# Altium footprint library En.PcbLib: 157 footprints (part 7 of 10)
Each footprint in its own frame and in the unit in brackets; x right, y up, seen from the top. Pads: shape width x height; smd on the part's side, far side on the other; paste and mask are expansions set on the pad; w line width, h text height; cw(c..) or ccw(c..) is an arc to the next point about the centre after c.
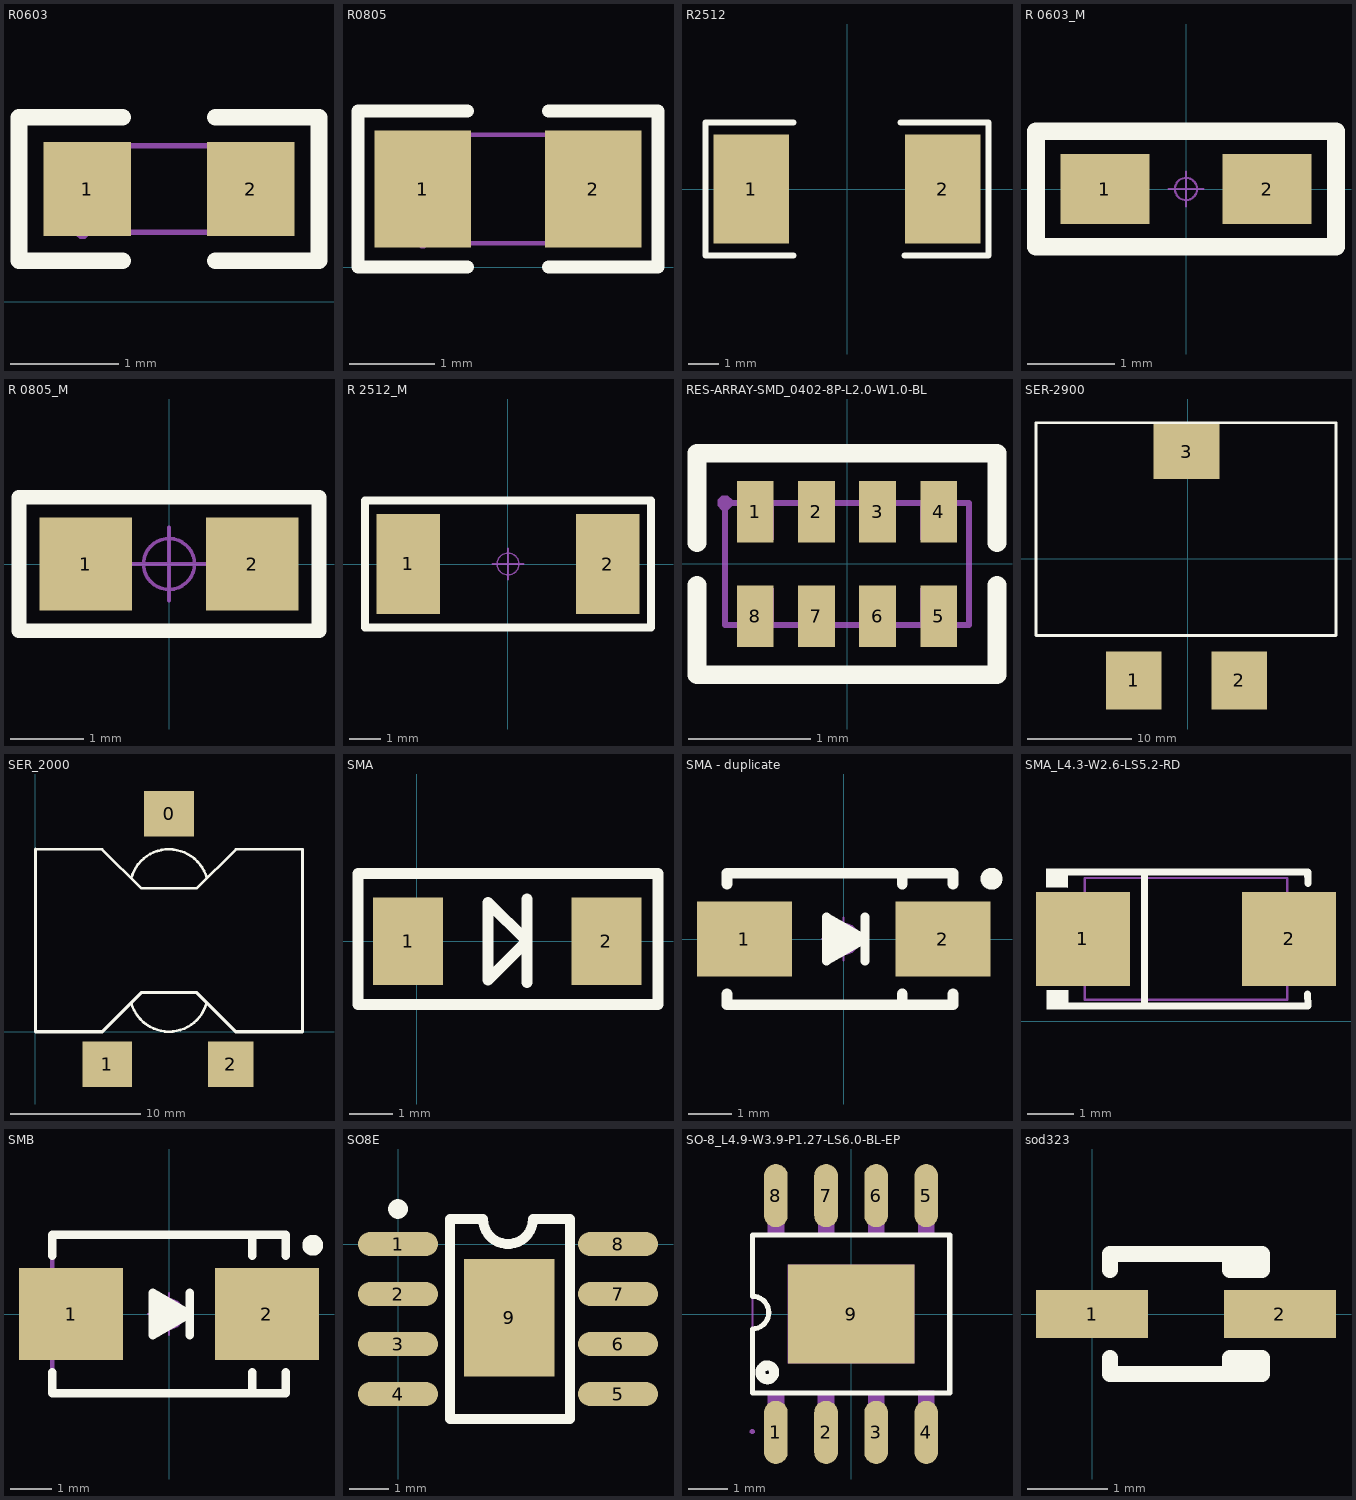
[diagram p6: the footprints below, top view; thin cyan lines are the x and y axes]

## R0603 [mm]
pads (2):
  rect 0.806x0.864 smd paste-100 mask+0.051: 1(33.906,1.042) 2(35.412,1.042)
Top Overlay:
  lines w0.152: 34.233,0.381 33.274,0.381 33.274,1.702 34.233,1.702 ; 35.085,0.381 36.044,0.381 36.044,1.702 35.085,1.702
Top Paste:
  region: 34.304,1.442 34.304,1.214 33.924,1.214 33.924,0.884 34.304,0.884 34.304,0.642 34.254,0.592 33.464,0.592 33.414,0.642 33.414,1.442 33.464,1.492 34.254,1.492
  region: 35.854,1.492 35.054,1.492 35.004,1.442 35.004,1.214 35.374,1.214 35.374,0.884 35.004,0.884 35.004,0.642 35.054,0.592 35.854,0.592 35.904,0.642 35.904,1.442
Mechanical 15:
  region: 33.919,0.642 33.919,0.666 33.884,0.702 33.834,0.702 33.799,0.666 33.799,0.642 33.799,0.617 33.834,0.582 33.884,0.582 33.919,0.617
  region: 35.459,0.642 35.459,1.442 35.159,1.442 35.159,0.642
  region: 33.859,0.642 33.859,1.442 34.159,1.442 34.159,0.642
  lines w0.051: 33.859,0.642 35.459,0.642 35.459,1.442 33.859,1.442 33.859,0.642
3D body "User Library-SMD RESISTOR-1.SLDPRT": height 0.45, standoff 0, extent 33.871,0.616 35.471,1.416

## R0805 [mm]
pads (2):
  rect 1.133x1.377 smd paste-100 mask+0.051: 1(9.016,0.917) 2(11.016,0.917)
Top Overlay:
  lines w0.152: 9.54,0 8.255,0 8.255,1.834 9.54,1.834 ; 10.492,0 11.777,0 11.777,1.834 10.492,1.834
Top Paste:
  region: 10.466,0.277 10.466,0.697 10.911,0.697 10.911,1.147 10.471,1.147 10.466,1.557 10.516,1.607 11.666,1.607 11.716,1.557 11.716,0.277 11.666,0.227 10.516,0.227
  region: 8.316,0.277 8.316,1.557 8.366,1.607 9.516,1.607 9.566,1.557 9.571,1.147 9.121,1.147 9.121,0.697 9.561,0.697 9.566,0.277 9.516,0.227 8.366,0.227
Mechanical 15:
  region: 9.076,0.28 9.075,0.304 9.04,0.337 8.992,0.337 8.957,0.304 8.956,0.28 8.957,0.256 8.992,0.222 9.04,0.222 9.075,0.256
  region: 11.016,0.28 11.016,1.555 10.616,1.555 10.616,0.28
  region: 9.016,0.28 9.016,1.555 9.416,1.555 9.416,0.28
  lines w0.051: 9.016,0.28 11.016,0.28 11.016,1.555 9.016,1.555 9.016,0.28
3D body "User Library-SMD RESISTOR-1 (1).SLDPRT": height 0.58, standoff -0.02, extent 9.033,0.302 11.033,1.552

## R2512 [mm]
pads (2):
  rect 2.5x3.6 smd: 1(-3.175,0) 2(3.175,0)
Top Overlay:
  lines w0.2: -1.778,-2.2 -4.699,-2.2 -4.699,2.2 -1.778,2.2 ; 1.778,2.2 4.699,2.2 4.699,-2.2 1.905,-2.2
3D body "User Library-SMD RESISTOR-1 (2).SLDPRT": height 0.58, standoff -0.02, extent -3.2,-1.6 3.2,1.6

## R 0603_M [mil] "1/10W贴片电阻"
height 370.08
pads (2):
  rect 40x31.5 smd: 1(-36.5,0) 2(36.5,0)
Top Overlay:
  lines w8: -67.5,-26 -67.5,26 67.5,26 67.5,-26 -67.5,-26
Mechanical 15:
  circle w1: c0,0 r5
  lines w1: -7.87,0 7.87,0 ; 0,-7.87 0,7.87
3D body "R 0603.STEP": height 15.79, standoff -0.13, extent -31.5,-15.75 31.5,15.75

## R 0805_M [mil] "1/8W贴片电阻"
pads (2):
  rect 50x50 smd: 1(-45,0) 2(45,0)
Top Overlay:
  lines w8: -81,-36 -81,36 81,36 81,-36 -81,-36
Mechanical 15:
  circle w1.97: c0,0 r13.78
  lines w1.97: -19.68,0 19.68,0 ; 0,-19.68 0,19.68
3D body "R 0805.STEP": height 19.72, standoff -0.24, extent -39.37,-24.61 39.37,24.61

## R 2512_M [mm] "1W贴片电阻"
height 9.4
pads (2):
  rect 2.032x3.2 smd: 1(-3.2,0) 2(3.2,0)
Top Overlay:
  lines w0.254: -4.572,-2.032 -4.572,2.032 4.572,2.032 4.572,-2.032 -4.572,-2.032
Mechanical 15:
  circle w0.05: c0,0 r0.35
  lines w0.05: -0.5,0 0.5,0 ; 0,-0.5 0,0.5
3D body "R 2512.STEP": height 0.55, standoff -0.02, extent -3.2,-1.6 3.2,1.6

## RES-ARRAY-SMD_0402-8P-L2.0-W1.0-BL [mm]
pads (8):
  rect 0.3x0.505 smd: 1(-0.75,0.427) 2(-0.25,0.427) 3(0.25,0.427) 4(0.75,0.427) 5(0.75,-0.427) 6(0.25,-0.427) 7(-0.25,-0.427) 8(-0.75,-0.427)
Top Overlay:
  lines w0.152: -1.229,-0.175 -1.229,-0.909 1.229,-0.909 1.229,-0.175 ; -1.229,0.175 -1.229,0.909 1.229,0.909 1.229,0.175
Mechanical 15:
  region: 0.6,-0.5 0.6,-0.2 0.9,-0.2 0.9,-0.5
  region: 0.1,-0.5 0.1,-0.2 0.4,-0.2 0.4,-0.5
  region: -0.4,-0.5 -0.4,-0.2 -0.1,-0.2 -0.1,-0.5
  region: -0.9,-0.5 -0.9,-0.2 -0.6,-0.2 -0.6,-0.5
  region: 0.6,0.5 0.6,0.2 0.9,0.2 0.9,0.5
  region: 0.1,0.5 0.1,0.2 0.4,0.2 0.4,0.5
  region: -0.4,0.5 -0.4,0.2 -0.1,0.2 -0.1,0.5
  region: -0.9,0.5 -0.9,0.2 -0.6,0.2 -0.6,0.5
  region: -0.94,0.5 -0.941,0.524 -0.976,0.559 -1.024,0.559 -1.059,0.524 -1.06,0.5 -1.059,0.475 -1.024,0.441 -0.975,0.441 -0.941,0.475
  lines w0.051: -1,-0.5 1,-0.5 1,0.5 -1,0.5 -1,-0.5
3D body "4d02wgj0103tce.step": height 0.45, standoff 0, extent -1.001,-0.5 1,0.5

## SER-2900 [mm]
pads (3):
  rect 5.33x5.59 smd: 1(-5.202,-11.684) 2(4.948,-11.684)
  rect 6.35x5.28 smd: 3(-0.127,10.316)
Top Overlay:
  lines w0.254: -14.605,-7.366 14.224,-7.366 14.224,13.081 -14.605,13.081 -14.605,-7.366
3D body "Coilcraft-SER2915H.SLDPRT": height 15.34, standoff -0.02, extent -13.951,-13.869 13.951,13.172

## SER_2000 [mm]
pads (3):
  rect 3.8x3.5 smd: 0(10.25,16.725) 1(5.5,-2.5)
  rect 3.5x3.5 smd: 2(15,-2.5)
Top Overlay:
  lines w0.2: 0,14 5.125,14 8.125,11 12.375,11 15.375,14 20.5,14 20.5,0 ; 7.351,2.226 ccw(c10.25,3) 13.141,2.197 ; 7.356,11.791 cw(c10.25,11) 13.149,11.774
  lines w0.254: 0,14 0,0 5.125,0 8.125,3 12.375,3 15.375,0 20.5,0
3D body "Coilcraft-SER2011.SLDPRT": height 10.42, standoff -0.25, extent 0.376,-2.238 20.066,16.462

## SMA [mil] "DO-214AC(2010)"
pads (2):
  rect 63x78.74 smd: 1(-8,0) 2(170.56,0)
Top Overlay:
  lines w10: 99,-37 99,38 ; -53,-57 217,-57 217,61 -53,61 -53,-57 ; 64,-35 99,0 64,35 64,-35
3D body "DO-214AC.STEP": height 94.49, standoff 0, extent -7.55,-52.15 173.55,54.15

## SMA - duplicate [mm] "4.5x2.6*2.2mm（长宽高，不包括引脚）"
height 2.54
pads (2):
  rect 2.2x1.75 smd: 1(-2.3,0) 2(2.3,0)
Top Overlay:
  circle w0.254: c3.429,1.397 r0.127
  lines w0.203: 0.494,-0.508 0.494,0.508 ; -0.395,-0.508 0.494,0 -0.395,0.508 -0.395,-0.508
  lines w0.254: -2.7,-1.27 -2.7,-1.524 2.54,-1.524 2.54,-1.27 ; -2.7,1.27 -2.7,1.524 2.54,1.524 2.54,1.27 ; -0.33,0.305 0.305,0 -0.254,-0.305 -0.254,0.051 0.023,0 ; 1.359,-1.486 1.359,-1.27 ; 1.359,1.27 1.359,1.397
Mechanical 15:
  circle w0.05: c0,0 r0.35
  lines w0.05: -0.5,0 0.5,0 ; 0,-0.5 0,0.5
3D body "SMA.STEP": height 2.15, standoff 0.04, extent -2.528,-1.3 2.575,1.3

## SMA_L4.3-W2.6-LS5.2-RD [mm]
pads (2):
  rect 2x2 smd: 1(15.097,1.757) 2(19.497,1.757)
Top Overlay:
  region: 14.777,3.259 14.776,2.852 14.316,2.857 14.32,3.259
  region: 14.785,0.661 14.784,0.254 14.324,0.259 14.328,0.661
  lines w0.152: 14.701,0.33 19.893,0.33 ; 14.701,3.183 19.893,3.183 19.9,2.944 ; 16.413,0.33 16.413,3.183 ; 19.89,0.581 19.897,0.342
Mechanical 6:
  region: 14.979,1.655 14.979,1.858 15.789,1.858 15.789,1.655
  region: 19.587,1.667 19.587,1.869 18.777,1.869 18.777,1.667
  region: 19.311,1.082 19.311,2.432 19.108,2.432 19.108,1.082
Mechanical 15:
  region: 14.752,0.457 14.751,0.481 14.716,0.515 14.667,0.515 14.632,0.481 14.632,0.457 14.632,0.432 14.667,0.398 14.716,0.398 14.751,0.432
  region: 19.902,2.481 19.902,1.031 18.777,1.031 18.777,2.481
  region: 15.817,2.482 15.817,1.032 14.692,1.032 14.692,2.482
  lines w0.051: 15.137,0.457 15.137,3.057 19.457,3.057 19.457,0.457 15.137,0.457
3D body "SMA.STEP": height 2.15, standoff 0.04, extent 14.593,0.478 19.696,3.078

## SMB [mm] "4.7*3.9*2.2mm(长宽高，不包括引脚）"
height 2.4
pads (2):
  rect 2.5x2.2 smd: 1(-2.35,0) 2(2.35,0)
Top Overlay:
  circle w0.25: c3.45,1.65 r0.125
  lines w0.2: -2.8,-1.4 -2.8,-1.9 2.8,-1.9 2.8,-1.4 ; -2.8,1.4 -2.8,1.9 2.8,1.9 2.8,1.4 ; 2,-1.9 2,-1.4 ; 2,1.4 2,1.9
  lines w0.203: 0.5,-0.508 0.5,0.508 ; -0.389,-0.508 -0.389,0.508 0.5,0 -0.389,-0.508
  lines w0.254: -0.254,0 0.279,0 ; 0.279,0 -0.229,0.279 -0.229,-0.305 0.279,0
Mechanical 13:
  lines w0.1: 2.8,-1.9 -2.8,-1.9 -2.8,1.9 2.8,1.9
Mechanical 15:
  circle w0.05: c0,0 r0.35
  lines w0.05: -0.5,0 0.5,0 ; 0,-0.5 0,0.5
3D body "SMB.STEP": height 2.35, standoff 0.04, extent -2.628,-1.8 2.675,1.8

## SO8E [mil]
pads (9):
  oval 80x24 smd: 1(0,0) 2(0,-50) 3(0,-100) 4(0,-150) 5(220,-150) 6(220,-100) 7(220,-50) 8(220,0)
  rect 90.55x117.72 smd: 9(111.23,-73.8)
Top Overlay:
  circle w9.84: c0,35 r4.92
  lines w10: 52,-175 172,-175 172,25 135,25 cw(c110,25) 85,25 52,25 52,-175
3D body "SOP8.STEP": height 62.99, standoff 0, extent -7.7,-172.62 230.17,25.02

## SO-8_L4.9-W3.9-P1.27-LS6.0-BL-EP [mil]
pads (9):
  oval 23.6x63 smd mask+2: 1(-75,-118.1) 2(-25,-118.1) 3(25,-118.1) 4(75,-118.1) 5(75,118.1) 6(25,118.1) 7(-25,118.1) 8(-75,118.1)
  rect 126x98.4 smd mask+2: 9(0,0)
Top Overlay:
  circle w10: c-83.6,-58.2 r6.9
  lines w5.1: -98.4,-78.7 98.4,-78.7 98.4,78.7 -98.4,78.7 -98.4,17.7 cw(c-98.41,1.46) -98.4,-14.8 -98.4,-78.7
Mechanical 6:
  circle w7.9: c-74.7,-127.4 r3.9
Mechanical 15:
  region: -96.3,-117.2 -96.3,-116.21 -97.71,-114.8 -99.69,-114.8 -101.1,-116.21 -101.1,-117.2 -101.1,-118.19 -99.69,-119.6 -97.71,-119.6 -96.3,-118.19 -96.3,-117.2
  region: -63,49.2 63,49.2 63,-49.2 -63,-49.2
  region: -66.9,-101.3 -83.1,-101.3 -83.1,-76.9 -66.9,-76.9
  region: -66.9,-116.9 -83.1,-116.9 -83.1,-101.2 -66.9,-101.2
  region: -16.9,-101.4 -33.1,-101.4 -33.1,-77 -16.9,-77
  region: -16.9,-117 -33.1,-117 -33.1,-101.3 -16.9,-101.3
  region: 33.1,-101.3 16.9,-101.3 16.9,-76.9 33.1,-76.9
  region: 33.1,-116.9 16.9,-116.9 16.9,-101.2 33.1,-101.2
  region: 83.1,-101.1 66.9,-101.1 66.9,-76.7 83.1,-76.7
  region: 83.1,-116.6 66.9,-116.6 66.9,-100.9 83.1,-100.9
  region: -66.9,77.2 -83.1,77.2 -83.1,101.7 -66.9,101.7
  region: -66.9,101.5 -83.1,101.5 -83.1,117.2 -66.9,117.2
  region: -16.8,78.3 -33,78.3 -33,102.8 -16.8,102.8
  region: -16.9,102.6 -33.1,102.6 -33.1,118.3 -16.9,118.3
  region: 33.2,78 17,78 17,102.5 33.2,102.5
  region: 33.1,102.3 16.9,102.3 16.9,118 33.1,118
  region: 83.1,77.2 66.9,77.2 66.9,101.7 83.1,101.7
  region: 83.1,101.6 66.9,101.6 66.9,117.3 83.1,117.3
  lines w2: -98.4,-77.6 98.4,-77.6 98.4,79.9 -98.4,79.9 -98.4,-77.6
3D body "SOP8.STEP": height 62.99, standoff 0, extent -98.82,-112.87 98.82,125

## sod323 [mm]
pads (2):
  rect 1.4x0.6 smd: 1(0,0) 2(2.35,0)
Top Overlay:
  lines w0.2: 0.225,-0.55 0.225,-0.75 2.125,-0.75 2.125,-0.55 1.725,-0.55 1.725,-0.75 ; 0.225,0.55 0.225,0.75 2.125,0.75 2.125,0.55 1.725,0.55 1.725,0.75
3D body "SOD-323.STEP": height 1, standoff 0, extent -0.169,-0.667 2.431,0.633